# Altium footprint library Standard2.PcbLib: 423 footprints (part 25 of 27)
Each footprint in its own frame and in the unit in brackets; x right, y up, seen from the top. Pads: shape width x height; smd on the part's side, far side on the other; paste and mask are expansions set on the pad; w line width, h text height; cw(c..) or ccw(c..) is an arc to the next point about the centre after c.
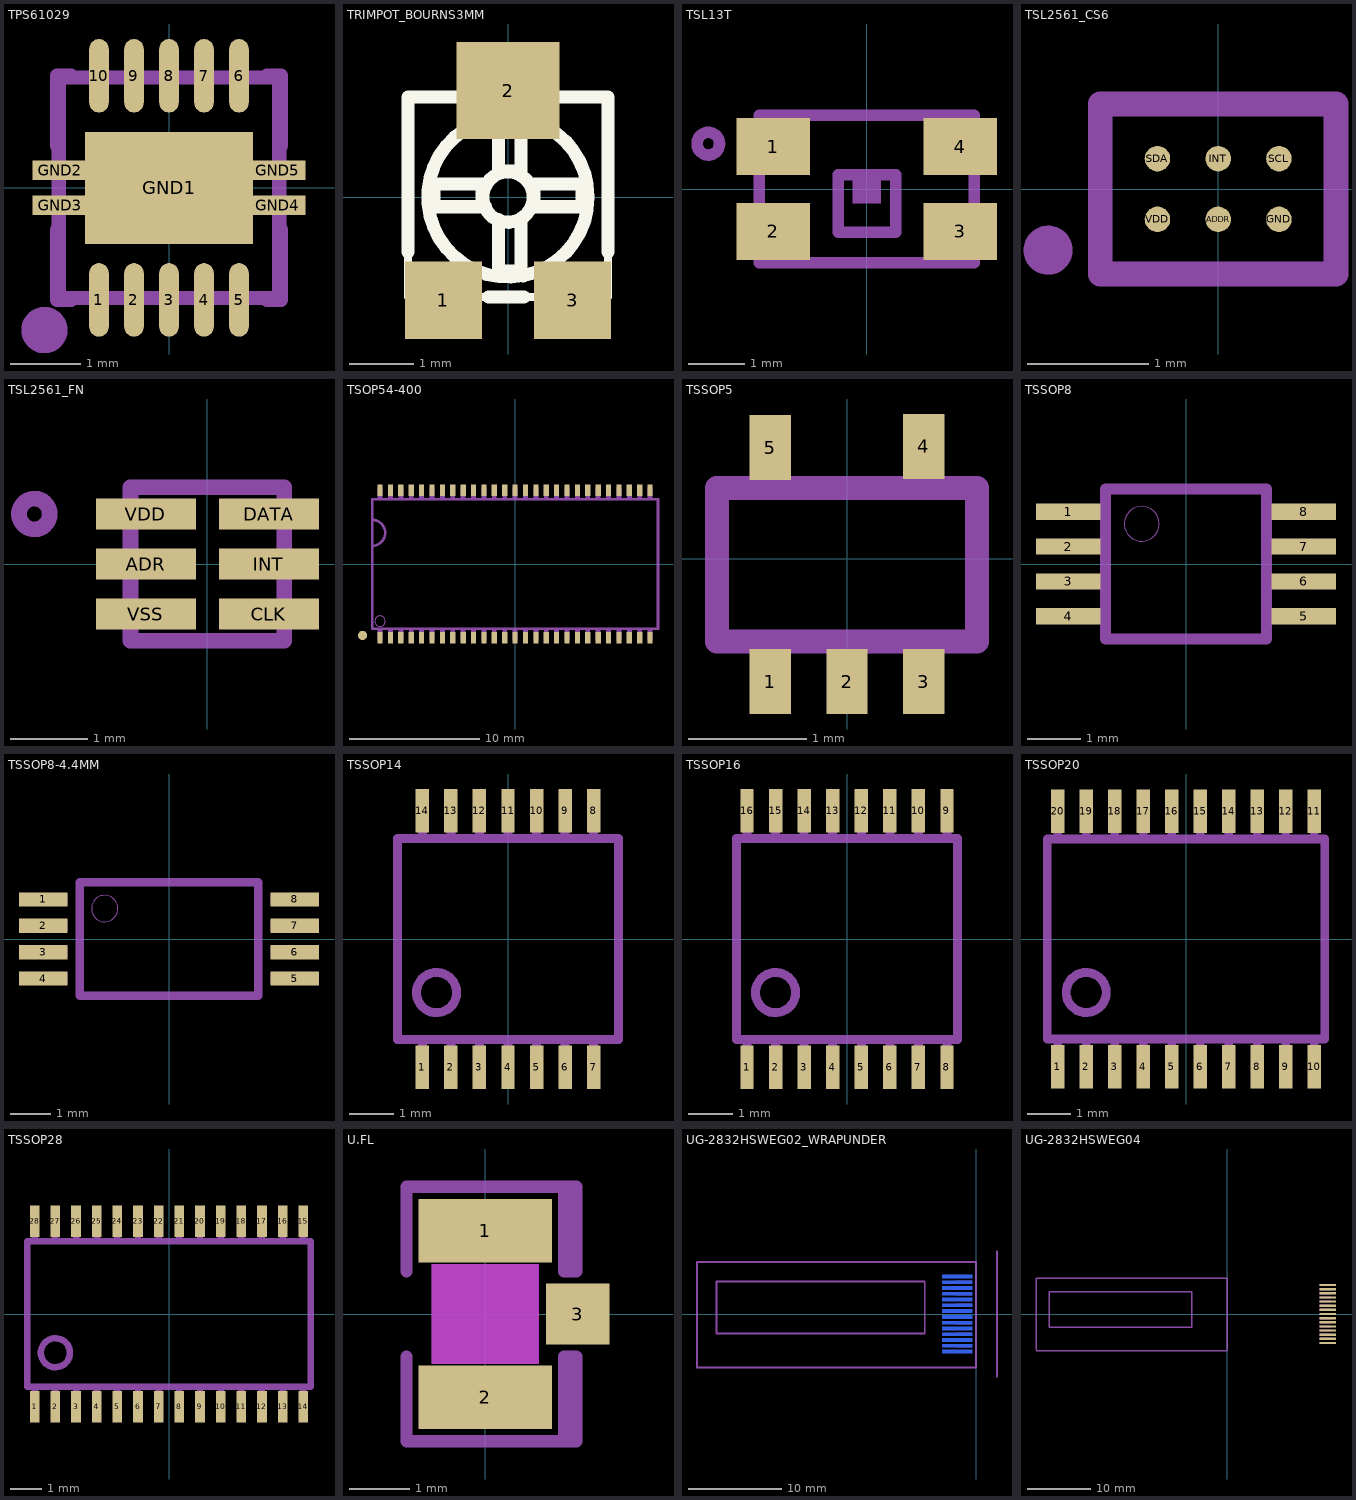
[diagram p24: the footprints below, top view; thin cyan lines are the x and y axes]

## TPS61029 [mm]
pads (15):
  rrect100% 0.28x1.05 smd: 1(-1,-1.6) 2(-0.5,-1.6) 3(0,-1.6) 4(0.5,-1.6) 5(1,-1.6) 6(1,1.6) 7(0.5,1.6) 8(0,1.6) 9(-0.5,1.6) 10(-1,1.6)
  rect 2.4x1.6 smd paste-1.2: GND1(0,0)
  rect 0.8x0.28 smd paste-0.4: GND2(-1.55,0.25) GND3(-1.55,-0.25) GND4(1.55,-0.25) GND5(1.55,0.25)
Top Paste:
  rectangle: -1.016,0.127 -0.254,0.635
  rectangle: -1.016,-0.635 -0.254,-0.127
  rectangle: 0.254,0.127 1.016,0.635
  rectangle: 0.254,-0.635 1.016,-0.127
  rectangle: -1.905,-0.381 -1.397,-0.127
  rectangle: -1.905,0.127 -1.397,0.381
  rectangle: 1.397,0.127 1.905,0.381
  rectangle: 1.397,-0.381 1.905,-0.127
Mechanical 2:
  circle w0.406: c-1.778,-2.032 r0.127
  lines w0.203: -1.6,-0.6 -1.6,-1.6 -1.4,-1.6 ; -1.6,0.6 -1.6,1.6 -1.4,1.6 ; 1.4,-1.6 1.6,-1.6 1.6,-0.6 ; 1.4,1.6 1.6,1.6 1.6,0.6
Mechanical 18:
  lines w0.203: -1.575,-1.575 1.575,-1.575 1.575,1.575 -1.575,1.575 -1.575,-1.575

## TRIMPOT_BOURNS3MM [mm]
pads (3):
  rect 1.2x1.2 smd: 1(-1,-1.6) 3(1,-1.6)
  rect 1.6x1.5 smd: 2(0,1.65)
Top Overlay:
  circle w0.203: c0,0 r0.39
  circle w0.203: c0,0 r1.242
  lines w0.127: -1.55,1.55 -1.55,-1.55 1.55,-1.55 1.55,1.55
  lines w0.203: -1.55,-0.85 -1.55,1.55 ; -0.95,1.55 -1.55,1.55 ; -0.4,-0.1 -0.4,0.2 -1.15,0.2 -1.15,-0.15 -0.35,-0.15 ; -0.3,-1.55 0.25,-1.55 ; -0.15,-0.35 -0.15,-1.15 0.2,-1.15 0.2,-0.35 ; -0.15,1.15 -0.15,0.4 0.2,0.4 0.2,1.15 ; 0.9,1.55 1.55,1.55 ; 1.55,-0.85 1.55,1.55 ; -1.55,1.55 1.55,1.55 ; 0.4,-0.15 1.15,-0.15 1.15,0.2 0.4,0.2 0.4,-0.15
Mechanical 18:
  lines w0.203: -0.15,1.15 0.2,1.15

## TSL13T [mm]
pads (4):
  rect 1.3x1 smd: 1(-1.65,0.75) 2(-1.65,-0.75) 3(1.65,-0.75) 4(1.65,0.75)
Mechanical 2:
  circle w0.203: c-2.8,0.8 r0.2
Mechanical 18:
  rectangle: -0.254,-0.254 0.254,0.254
  lines w0.203: -1.9,-1.3 1.9,-1.3 1.9,1.3 -1.9,1.3 -1.9,-1.3 ; -0.508,-0.762 0.508,-0.762 0.508,0.254 -0.508,0.254 -0.508,-0.762

## TSL2561_CS6 [mm]
pads (6):
  rrect100% 0.21x0.21 smd: ADDR(0,-0.25) GND(0.5,-0.25) INT(0,0.25) SCL(0.5,0.25) SDA(-0.5,0.25) VDD(-0.5,-0.25)
Mechanical 2:
  circle w0.203: c-1.4,-0.504 r0.1
  lines w0.203: -0.97,-0.7 -0.97,0.7 0.97,0.7 0.97,-0.7 -0.97,-0.7
Mechanical 18:
  lines w0.127: -0.97,-0.7 0.97,-0.7 0.97,0.7 -0.97,0.7 -0.97,-0.7

## TSL2561_FN [mil]
pads (6):
  rect 51.18x15.75 smd paste-25.59: ADR(-31.5,0) CLK(31.5,-25.59) DATA(31.5,25.59) INT(31.5,0) VDD(-31.5,25.59) VSS(-31.5,-25.59)
Top Paste:
  rectangle: -56.3,17.91 -17.91,33.27
  rectangle: -56.3,-7.68 -17.91,7.68
  rectangle: -56.3,-33.27 -17.91,-17.91
  rectangle: 17.91,17.91 56.3,33.27
  rectangle: 17.91,-7.68 56.3,7.68
  rectangle: 17.91,-33.27 56.3,-17.91
Mechanical 2:
  circle w8: c-88.58,25.59 r7.87
Mechanical 18:
  lines w8: -39.37,-39.37 39.37,-39.37 39.37,39.37 -39.37,39.37 -39.37,-39.37

## TSOP54-400 [mm]
pads (55):
  rect 0.4x0.9 smd: 1(-10.4,-5.68) 2(-9.6,-5.68) 3(-8.8,-5.68) 4(-8,-5.68) 5(-7.2,-5.68) 6(-6.4,-5.68) 7(-5.6,-5.68) 8(-4.8,-5.68) 9(-4,-5.68) 10(-3.2,-5.68) 11(-2.4,-5.68) 12(-1.6,-5.68) 13(-0.8,-5.68) 14(0,-5.68) 15(0.8,-5.68) 16(1.6,-5.68) 17(2.4,-5.68) 18(3.2,-5.68) 19(4,-5.68) 20(4.8,-5.68) 21(5.6,-5.68) 22(6.4,-5.68) 23(7.2,-5.68) 24(8,-5.68) 25(8.8,-5.68) 26(9.6,-5.68) 27(10.4,-5.68) 28(10.4,5.68) 29(9.6,5.68) 30(8.8,5.68) 31(8,5.68) 32(7.2,5.68) 33(6.4,5.68) 34(5.6,5.68) 35(4.8,5.68) 36(4,5.68) 37(3.2,5.68) 38(2.4,5.68) 39(1.6,5.68) 40(0.8,5.68) 41(0,5.68) 42(-0.8,5.68) 43(-1.6,5.68) 44(-2.4,5.68) 45(-3.2,5.68) 46(-4,5.68) 47(-4.8,5.68) 48(-5.6,5.68) 49(-6.4,5.68) 50(-7.2,5.68) 51(-8,5.68) 52(-8.8,5.68) 53(-9.6,5.68) 54(-10.4,5.68)
  rrect100% 0.7x0.7 smd paste-0.35: P$1(-11.75,-5.5)
Mechanical 2:
  circle w0: c-10.4,-4.4 r0.4
  lines w0.203: -11.008,1.4 ccw(c-11.008,2.4) -11.008,3.4 ; -11.008,1.4 -11.008,3.4 ; -11.008,1.4 -11.008,-4.978 11.008,-4.978 11.008,4.978 -11.008,4.978 -11.008,3.4
Mechanical 18:
  region: -10.213,-5.88 -10.213,-5.08 -10.587,-5.08 -10.587,-5.88
  region: -9.412,-5.88 -9.412,-5.08 -9.787,-5.08 -9.787,-5.88
  region: -8.613,-5.88 -8.613,-5.08 -8.987,-5.08 -8.987,-5.88
  region: -7.813,-5.88 -7.813,-5.08 -8.187,-5.08 -8.187,-5.88
  region: -7.013,-5.88 -7.013,-5.08 -7.387,-5.08 -7.387,-5.88
  region: -6.213,-5.88 -6.213,-5.08 -6.587,-5.08 -6.587,-5.88
  region: -5.412,-5.88 -5.412,-5.08 -5.787,-5.08 -5.787,-5.88
  region: -4.613,-5.88 -4.613,-5.08 -4.987,-5.08 -4.987,-5.88
  region: -3.813,-5.88 -3.813,-5.08 -4.187,-5.08 -4.187,-5.88
  region: -3.013,-5.88 -3.013,-5.08 -3.387,-5.08 -3.387,-5.88
  region: -2.213,-5.88 -2.213,-5.08 -2.587,-5.08 -2.587,-5.88
  region: -1.412,-5.88 -1.412,-5.08 -1.787,-5.08 -1.787,-5.88
  region: -0.613,-5.88 -0.613,-5.08 -0.987,-5.08 -0.987,-5.88
  region: 0.187,-5.88 0.187,-5.08 -0.187,-5.08 -0.187,-5.88
  region: 0.987,-5.88 0.987,-5.08 0.613,-5.08 0.613,-5.88
  region: 1.787,-5.88 1.787,-5.08 1.412,-5.08 1.412,-5.88
  region: 2.587,-5.88 2.587,-5.08 2.213,-5.08 2.213,-5.88
  region: 3.387,-5.88 3.387,-5.08 3.013,-5.08 3.013,-5.88
  region: 4.187,-5.88 4.187,-5.08 3.813,-5.08 3.813,-5.88
  region: 4.987,-5.88 4.987,-5.08 4.613,-5.08 4.613,-5.88
  region: 5.787,-5.88 5.787,-5.08 5.412,-5.08 5.412,-5.88
  region: 6.587,-5.88 6.587,-5.08 6.213,-5.08 6.213,-5.88
  region: 7.387,-5.88 7.387,-5.08 7.013,-5.08 7.013,-5.88
  region: 8.187,-5.88 8.187,-5.08 7.813,-5.08 7.813,-5.88
  region: 8.987,-5.88 8.987,-5.08 8.613,-5.08 8.613,-5.88
  region: 9.787,-5.88 9.787,-5.08 9.412,-5.08 9.412,-5.88
  region: 10.587,-5.88 10.587,-5.08 10.213,-5.08 10.213,-5.88
  region: 10.213,5.88 10.213,5.08 10.587,5.08 10.587,5.88
  region: 9.787,5.08 9.787,5.88 9.412,5.88 9.412,5.08
  region: 8.987,5.08 8.987,5.88 8.613,5.88 8.613,5.08
  region: 8.187,5.08 8.187,5.88 7.813,5.88 7.813,5.08
  region: 7.387,5.08 7.387,5.88 7.013,5.88 7.013,5.08
  region: 6.587,5.08 6.587,5.88 6.213,5.88 6.213,5.08
  region: 5.787,5.08 5.787,5.88 5.412,5.88 5.412,5.08
  region: 4.987,5.08 4.987,5.88 4.613,5.88 4.613,5.08
  region: 4.187,5.08 4.187,5.88 3.813,5.88 3.813,5.08
  region: 3.387,5.08 3.387,5.88 3.013,5.88 3.013,5.08
  region: 2.587,5.08 2.587,5.88 2.213,5.88 2.213,5.08
  region: 1.787,5.08 1.787,5.88 1.412,5.88 1.412,5.08
  region: 0.987,5.08 0.987,5.88 0.613,5.88 0.613,5.08
  region: 0.187,5.08 0.187,5.88 -0.187,5.88 -0.187,5.08
  region: -0.613,5.08 -0.613,5.88 -0.987,5.88 -0.987,5.08
  region: -1.412,5.08 -1.412,5.88 -1.787,5.88 -1.787,5.08
  region: -2.213,5.08 -2.213,5.88 -2.587,5.88 -2.587,5.08
  region: -3.013,5.08 -3.013,5.88 -3.387,5.88 -3.387,5.08
  region: -3.813,5.08 -3.813,5.88 -4.187,5.88 -4.187,5.08
  region: -4.613,5.08 -4.613,5.88 -4.987,5.88 -4.987,5.08
  region: -5.412,5.08 -5.412,5.88 -5.787,5.88 -5.787,5.08
  region: -6.213,5.08 -6.213,5.88 -6.587,5.88 -6.587,5.08
  region: -7.013,5.08 -7.013,5.88 -7.387,5.88 -7.387,5.08
  region: -7.813,5.08 -7.813,5.88 -8.187,5.88 -8.187,5.08
  region: -8.613,5.08 -8.613,5.88 -8.987,5.88 -8.987,5.08
  region: -9.412,5.08 -9.412,5.88 -9.787,5.88 -9.787,5.08
  region: -10.213,5.08 -10.213,5.88 -10.587,5.88 -10.587,5.08

## TSSOP5 [mm]
pads (5):
  rect 0.35x0.55 smd: 1(-0.65,-1.04) 2(0,-1.04) 3(0.65,-1.04) 4(0.65,0.95) 5(-0.65,0.94)
Mechanical 2:
  lines w0.203: -0.99,-0.7 -1.1,-0.7 -1.1,0.6 -0.99,0.6 ; 1,-0.7 1.1,-0.7 1.1,0.6 1.02,0.6
Mechanical 18:
  lines w0.127: -1.1,-0.7 -1.1,0.6 ; 1.1,-0.7 1.1,0.6
  lines w0.203: -1.1,-0.7 1.1,-0.7 ; -1.1,0.6 1.1,0.6

## TSSOP8 [mil]
pads (8):
  rect 47.24x12 smd paste-23.62: 1(-86.61,38.39) 2(-86.61,12.8) 3(-86.61,-12.8) 4(-86.61,-38.39) 5(86.61,-38.39) 6(86.61,-12.8) 7(86.61,12.8) 8(86.61,38.39)
Top Paste:
  rectangle: -109,34 -65,43
  rectangle: -109,8 -65,17
  rectangle: -109,-17 -65,-8
  rectangle: -109,-43 -65,-34
  rectangle: 65,-43 109,-34
  rectangle: 65,-17 109,-8
  rectangle: 65,8 109,17
  rectangle: 65,34 109,43
Mechanical 2:
  circle w0: c-32.48,29.53 r12.8
  lines w8: -59.06,-55.12 59.06,-55.12 59.06,55.12 -59.06,55.12 -59.06,-55.12
Mechanical 18:
  rectangle: -102.36,33.46 -62.99,43.31
  rectangle: -102.36,7.87 -62.99,17.72
  rectangle: -102.36,-17.72 -62.99,-7.87
  rectangle: -102.36,-43.31 -62.99,-33.46
  rectangle: 62.99,-43.31 102.36,-33.46
  rectangle: 62.99,-17.72 102.36,-7.87
  rectangle: 62.99,7.87 102.36,17.72
  rectangle: 62.99,33.46 102.36,43.31

## TSSOP8-4.4MM [mm]
pads (8):
  rect 1.2x0.35 smd: 1(-3.1,0.975) 2(-3.1,0.325) 3(-3.1,-0.325) 4(-3.1,-0.975) 5(3.1,-0.975) 6(3.1,-0.325) 7(3.1,0.325) 8(3.1,0.975)
Mechanical 2:
  circle w0: c-1.587,0.75 r0.325
  lines w0.203: -2.2,-1.4 2.2,-1.4 2.2,1.4 -2.2,1.4 -2.2,-1.4
Mechanical 18:
  rectangle: -3.5,0.85 -2.5,1.1
  rectangle: -3.5,0.2 -2.5,0.45
  rectangle: -3.5,-0.45 -2.5,-0.2
  rectangle: -3.5,-1.1 -2.5,-0.85
  rectangle: 2.5,-1.1 3.5,-0.85
  rectangle: 2.5,-0.45 3.5,-0.2
  rectangle: 2.5,0.2 3.5,0.45
  rectangle: 2.5,0.85 3.5,1.1

## TSSOP14 [mil]
pads (14):
  rect 12x39 smd: 1(-76.77,-114.87) 2(-51.18,-114.87) 3(-25.59,-114.87) 4(0,-114.87) 5(25.59,-114.87) 6(51.18,-114.87) 7(76.77,-114.87) 8(76.77,114.87) 9(51.18,114.87) 10(25.59,114.87) 11(0,114.87) 12(-25.59,114.87) 13(-51.18,114.87) 14(-76.77,114.87)
Mechanical 2:
  circle w8: c-64,-48 r18
  lines w8: -99,-89.87 -99,89.87 ; 99,-89.87 99,89.87
Mechanical 18:
  rectangle: -80.77,-122.87 -72.77,-89.87
  rectangle: -55.18,-122.87 -47.18,-89.87
  rectangle: -29.59,-122.87 -21.59,-89.87
  rectangle: -4,-122.87 4,-89.87
  rectangle: 21.59,-122.87 29.59,-89.87
  rectangle: 47.18,-122.87 55.18,-89.87
  rectangle: 72.77,-122.87 80.77,-89.87
  rectangle: 72.77,89.87 80.77,122.87
  rectangle: 47.18,89.87 55.18,122.87
  rectangle: 21.59,89.87 29.59,122.87
  rectangle: -4,89.87 4,122.87
  rectangle: -29.59,89.87 -21.59,122.87
  rectangle: -55.18,89.87 -47.18,122.87
  rectangle: -80.77,89.87 -72.77,122.87
  lines w8: -99,-89.87 99,-89.87 ; -99,89.87 99,89.87

## TSSOP16 [mil]
pads (16):
  rect 12x39 smd: 1(-89.57,-114.87) 2(-63.98,-114.87) 3(-38.39,-114.87) 4(-12.8,-114.87) 5(12.8,-114.87) 6(38.39,-114.87) 7(63.98,-114.87) 8(89.57,-114.87) 9(89.57,114.87) 10(63.98,114.87) 11(38.39,114.87) 12(12.8,114.87) 13(-12.8,114.87) 14(-38.39,114.87) 15(-63.98,114.87) 16(-89.57,114.87)
Mechanical 2:
  circle w8: c-64,-48 r18
  lines w8: -99,-89.87 -99,89.87 ; 99,-89.87 99,89.87
Mechanical 18:
  rectangle: -93.57,-122.87 -85.57,-89.87
  rectangle: -67.98,-122.87 -59.98,-89.87
  rectangle: -42.39,-122.87 -34.39,-89.87
  rectangle: -16.8,-122.87 -8.8,-89.87
  rectangle: 8.8,-122.87 16.8,-89.87
  rectangle: 34.39,-122.87 42.39,-89.87
  rectangle: 59.98,-122.87 67.98,-89.87
  rectangle: 85.57,-122.87 93.57,-89.87
  rectangle: 85.57,89.87 93.57,122.87
  rectangle: 59.98,89.87 67.98,122.87
  rectangle: 34.39,89.87 42.39,122.87
  rectangle: 8.8,89.87 16.8,122.87
  rectangle: -16.8,89.87 -8.8,122.87
  rectangle: -42.39,89.87 -34.39,122.87
  rectangle: -67.98,89.87 -59.98,122.87
  rectangle: -93.57,89.87 -85.57,122.87
  lines w8: -99,-89.87 99,-89.87 ; -99,89.87 99,89.87

## TSSOP20 [mil]
pads (20):
  rect 12x39 smd: 1(-115.16,-114.87) 2(-89.57,-114.87) 3(-63.98,-114.87) 4(-38.39,-114.87) 5(-12.8,-114.87) 6(12.8,-114.87) 7(38.39,-114.87) 8(63.98,-114.87) 9(89.57,-114.87) 10(115.16,-114.87) 11(115.16,114.87) 12(89.57,114.87) 13(63.98,114.87) 14(38.39,114.87) 15(12.8,114.87) 16(-12.8,114.87) 17(-38.39,114.87) 18(-63.98,114.87) 19(-89.57,114.87) 20(-115.16,114.87)
Mechanical 2:
  circle w8: c-89.59,-48 r18
  lines w8: -124.59,-89.87 -124.59,89.87 ; 124.59,-89.87 124.59,89.87
Mechanical 18:
  rectangle: -119.16,-122.87 -111.16,-89.87
  rectangle: -93.57,-122.87 -85.57,-89.87
  rectangle: -67.98,-122.87 -59.98,-89.87
  rectangle: -42.39,-122.87 -34.39,-89.87
  rectangle: -16.8,-122.87 -8.8,-89.87
  rectangle: 8.8,-122.87 16.8,-89.87
  rectangle: 34.39,-122.87 42.39,-89.87
  rectangle: 59.98,-122.87 67.98,-89.87
  rectangle: 59.98,89.87 67.98,122.87
  rectangle: 34.39,89.87 42.39,122.87
  rectangle: 8.8,89.87 16.8,122.87
  rectangle: -16.8,89.87 -8.8,122.87
  rectangle: -42.39,89.87 -34.39,122.87
  rectangle: -67.98,89.87 -59.98,122.87
  rectangle: -93.57,89.87 -85.57,122.87
  rectangle: -119.16,89.87 -111.16,122.87
  rectangle: 85.57,-122.87 93.57,-89.87
  rectangle: 111.16,-122.87 119.16,-89.87
  rectangle: 85.57,89.87 93.57,122.87
  rectangle: 111.16,89.87 119.16,122.87
  lines w8: -124.59,-89.87 124.59,-89.87 ; -124.59,89.87 124.59,89.87

## TSSOP28 [mil]
pads (28):
  rect 12x39 smd: 1(-166.34,-114.87) 2(-140.75,-114.87) 3(-115.16,-114.87) 4(-89.57,-114.87) 5(-63.98,-114.87) 6(-38.39,-114.87) 7(-12.8,-114.87) 8(12.8,-114.87) 9(38.39,-114.87) 10(63.98,-114.87) 11(89.57,-114.87) 12(115.16,-114.87) 13(140.75,-114.87) 14(166.34,-114.87) 15(166.34,114.87) 16(140.75,114.87) 17(115.16,114.87) 18(89.57,114.87) 19(63.98,114.87) 20(38.39,114.87) 21(12.8,114.87) 22(-12.8,114.87) 23(-38.39,114.87) 24(-63.98,114.87) 25(-89.57,114.87) 26(-115.16,114.87) 27(-140.75,114.87) 28(-166.34,114.87)
Mechanical 2:
  circle w8: c-140.77,-48 r18
  lines w8: -175.77,-89.87 -175.77,89.87 ; 175.77,-89.87 175.77,89.87
Mechanical 18:
  rectangle: -170.34,-122.87 -162.34,-89.87
  rectangle: -144.75,-122.87 -136.75,-89.87
  rectangle: -119.16,-122.87 -111.16,-89.87
  rectangle: -93.57,-122.87 -85.57,-89.87
  rectangle: -67.98,-122.87 -59.98,-89.87
  rectangle: -42.39,-122.87 -34.39,-89.87
  rectangle: -16.8,-122.87 -8.8,-89.87
  rectangle: 8.8,-122.87 16.8,-89.87
  rectangle: 8.8,89.87 16.8,122.87
  rectangle: -16.8,89.87 -8.8,122.87
  rectangle: -42.39,89.87 -34.39,122.87
  rectangle: -67.98,89.87 -59.98,122.87
  rectangle: -93.57,89.87 -85.57,122.87
  rectangle: -119.16,89.87 -111.16,122.87
  rectangle: -144.75,89.87 -136.75,122.87
  rectangle: -170.34,89.87 -162.34,122.87
  rectangle: 34.39,-122.87 42.39,-89.87
  rectangle: 59.98,-122.87 67.98,-89.87
  rectangle: 34.39,89.87 42.39,122.87
  rectangle: 59.98,89.87 67.98,122.87
  rectangle: 85.57,-122.87 93.57,-89.87
  rectangle: 111.16,-122.87 119.16,-89.87
  rectangle: 136.75,-122.87 144.75,-89.87
  rectangle: 162.34,-122.87 170.34,-89.87
  rectangle: 162.34,89.87 170.34,122.87
  rectangle: 136.75,89.87 144.75,122.87
  rectangle: 111.16,89.87 119.16,122.87
  rectangle: 85.57,89.87 93.57,122.87
  lines w8: -175.77,-89.87 175.77,-89.87 ; -175.77,89.87 175.77,89.87

## U.FL [mm]
pads (3):
  rect 2.2x1.05 smd: 1(0,1.375) 2(0,-1.375)
  rect 1.05x1 smd: 3(1.525,0)
Mechanical 2:
  lines w0.203: -1.3,-0.7 -1.3,-2.1 1.3,-2.1 ; -1.3,0.7 -1.3,2.1 1.3,2.1 ; 1.4,-2 1.4,-0.7 ; 1.4,0.7 1.4,2 ; 1.3,-2.1 1.3,-0.7 1.5,-0.7 1.5,-2.1 1.3,-2.1 ; 1.3,2.1 1.3,0.7 1.5,0.7 1.5,2.1 1.3,2.1
Mechanical 10 keep-out:
  rectangle: -0.889,-0.826 0.889,0.826

## UG-2832HSWEG02_WRAPUNDER [mm]
pads (14):
  rect 3.2x0.35 smd far side: 1(-2.03,-4.03) 2(-2.03,-3.41) 3(-2.03,-2.79) 4(-2.03,-2.17) 5(-2.03,-1.55) 6(-2.03,-0.93) 7(-2.03,-0.31) 8(-2.03,0.31) 9(-2.03,0.93) 10(-2.03,1.55) 11(-2.03,2.17) 12(-2.03,2.79) 13(-2.03,3.41) 14(-2.03,4.03)
Mechanical 2:
  lines w0.203: -30,-5.75 0,-5.75 0,5.575 -30,5.575 -30,-5.75
Mechanical 18:
  lines w0.127: -30,-5.75 0,-5.75 ; -30,-5.575 -30,5.575 0,5.575 0,-5.575
  lines w0.203: 2.25,-6.75 2.25,6.75 ; -27.9,-2.109 -5.516,-2.109 -5.516,3.475 -27.9,3.475 -27.9,-2.109
Mechanical 19:
  rectangle: -2.23,-4.205 -0.43,-3.855
  rectangle: -2.23,-3.585 -0.43,-3.235
  rectangle: -2.23,-2.965 -0.43,-2.615
  rectangle: -2.23,-2.345 -0.43,-1.995
  rectangle: -2.23,-1.725 -0.43,-1.375
  rectangle: -2.23,-1.105 -0.43,-0.755
  rectangle: -2.23,-0.485 -0.43,-0.135
  rectangle: -2.23,0.135 -0.43,0.485
  rectangle: -2.23,0.755 -0.43,1.105
  rectangle: -2.23,1.375 -0.43,1.725
  rectangle: -2.23,1.995 -0.43,2.345
  rectangle: -2.23,2.615 -0.43,2.965
  rectangle: -2.23,3.235 -0.43,3.585
  rectangle: -2.23,3.855 -0.43,4.205

## UG-2832HSWEG04 [mm]
pads (15):
  rect 2.6x0.35 smd: 1(15.8,-4.55) 2(15.8,-3.9) 3(15.8,-3.25) 4(15.8,-2.6) 5(15.8,-1.95) 6(15.8,-1.3) 7(15.8,-0.65) 8(15.8,0) 9(15.8,0.65) 10(15.8,1.3) 11(15.8,1.95) 12(15.8,2.6) 13(15.8,3.25) 14(15.8,3.9) 15(15.8,4.55)
Mechanical 2:
  lines w0.203: -30,-5.75 0,-5.75 ; -30,-5.575 -30,5.575 0,5.575 0,-5.575
Mechanical 18:
  rectangle: 14.5,-0.175 16.3,0.175
  rectangle: 14.5,4.375 16.3,4.725
  rectangle: 14.5,3.725 16.3,4.075
  rectangle: 14.5,3.075 16.3,3.425
  rectangle: 14.5,2.425 16.3,2.775
  rectangle: 14.5,1.775 16.3,2.125
  rectangle: 14.5,1.125 16.3,1.475
  rectangle: 14.5,0.475 16.3,0.825
  rectangle: 14.5,-0.825 16.3,-0.475
  rectangle: 14.5,-1.475 16.3,-1.125
  rectangle: 14.5,-2.125 16.3,-1.775
  rectangle: 14.5,-2.775 16.3,-2.425
  rectangle: 14.5,-3.425 16.3,-3.075
  rectangle: 14.5,-4.075 16.3,-3.725
  rectangle: 14.5,-4.725 16.3,-4.375
  lines w0.127: -30,-5.75 0,-5.75 ; -30,-5.575 -30,5.575 0,5.575 0,-5.575
  lines w0.203: -27.9,-2.109 -5.516,-2.109 -5.516,3.475 -27.9,3.475 -27.9,-2.109